# Altium footprint library FootprintsOld.PcbLib: 93 footprints (part 1 of 6)
Each footprint in its own frame and in the unit in brackets; x right, y up, seen from the top. Pads: shape width x height; smd on the part's side, far side on the other; paste and mask are expansions set on the pad; w line width, h text height; cw(c..) or ccw(c..) is an arc to the next point about the centre after c.
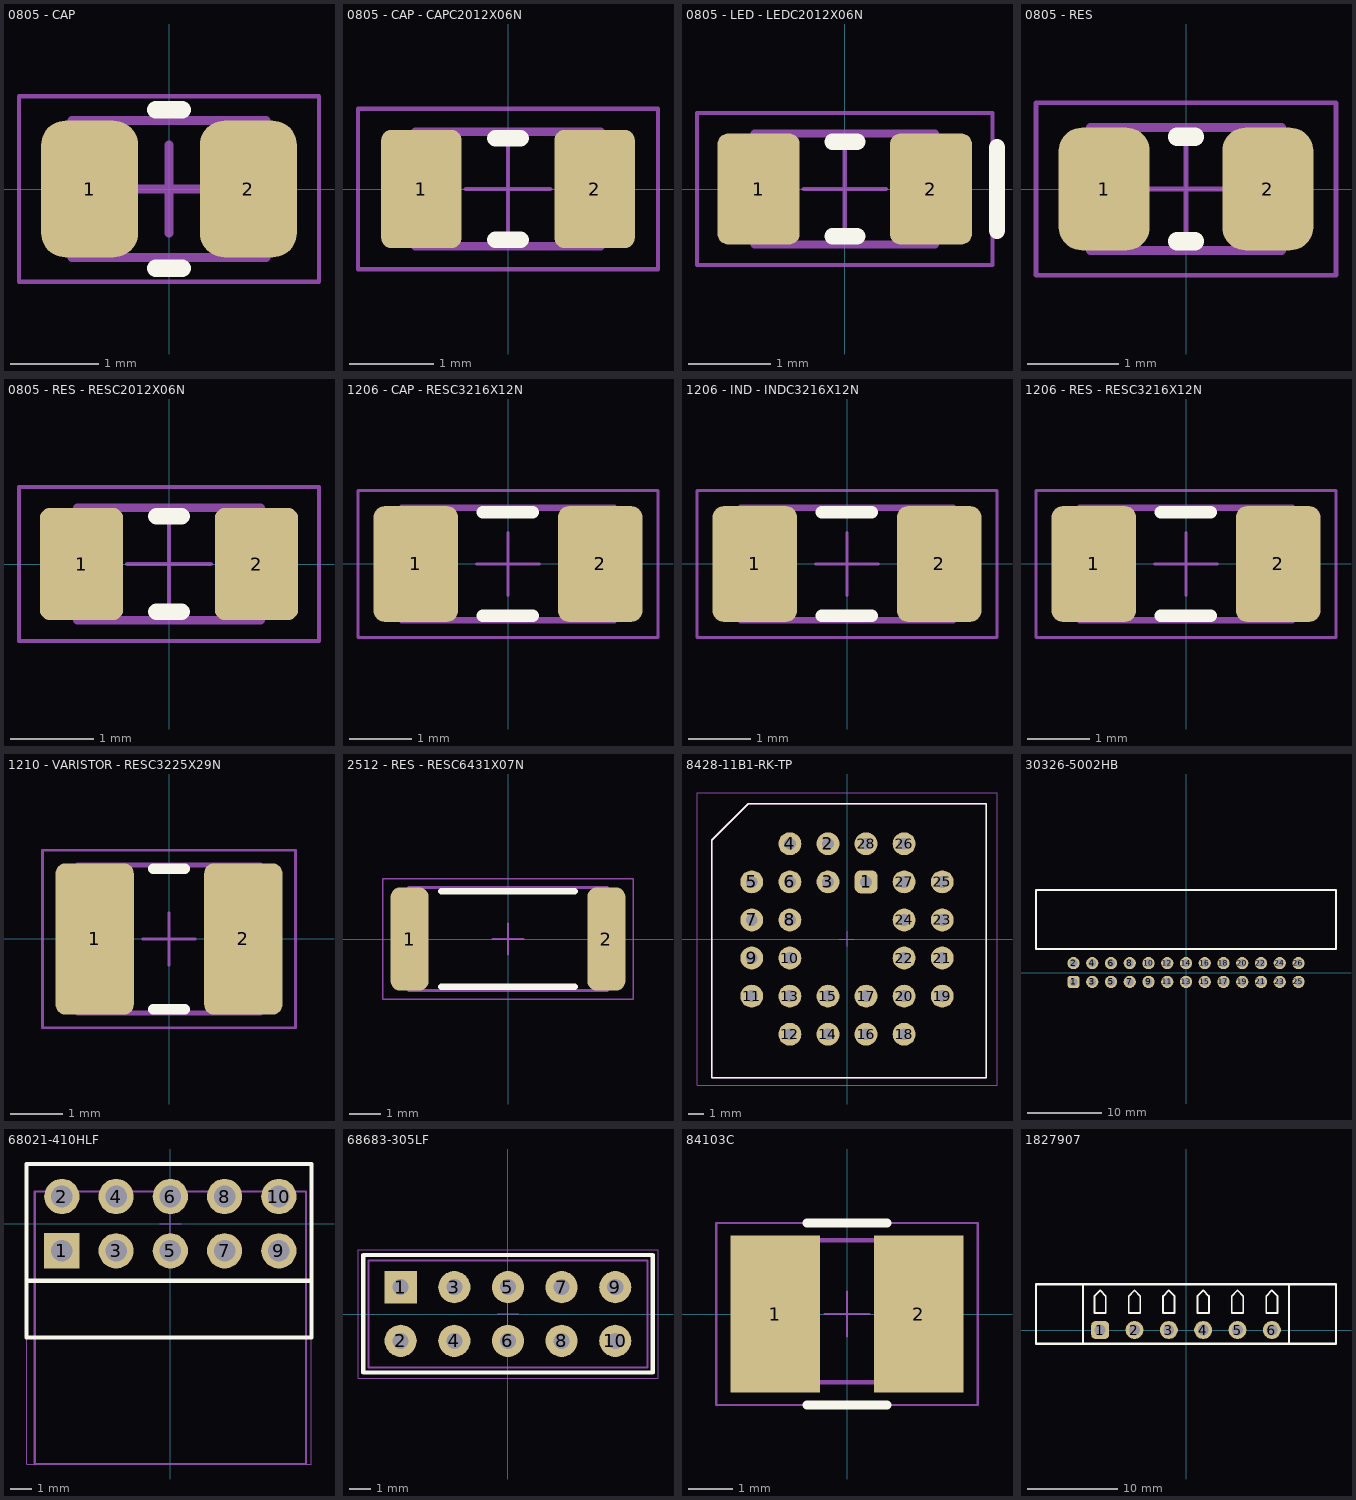
[diagram p0: the footprints below, top view; thin cyan lines are the x and y axes]

## 0805 - CAP [mm] "Chip Capacitor, 2-Leads, Body 2.00x1.30mm, IPC Medium Density"
height 1
pads (2):
  rrect50% 1.1x1.55 smd: 1(-0.9,0) 2(0.9,0)
Top Overlay:
  lines w0.2: -0.15,-0.9 0.15,-0.9 ; -0.15,0.9 0.15,0.9
Top Assembly:
  lines w0.1: -1.1,-0.775 1.1,-0.775 1.1,0.775 -1.1,0.775 -1.1,-0.775
Courtyard Top (Mech10):
  lines w0.05: -1.7,-1.05 1.7,-1.05 1.7,1.05 -1.7,1.05 -1.7,-1.05
  lines w0.1: -0.5,0 0.5,0 ; 0,-0.5 0,0.5
3D body: height 1, standoff 0, extent -0.6,-0.775 0.6,0.775
3D body: height 1, standoff 0, extent 0.6,-0.775 1.1,0.775
3D body: height 1, standoff 0, extent -1.1,-0.775 -0.6,0.775

## 0805 - CAP - CAPC2012X06N [mm] "Chip Capacitor, 2-Leads, Body 2.0x1.3mm, IPC Medium Density"
height 0.6
pads (2):
  rrect25% 0.95x1.4 smd: 1(-1.025,0) 2(1.025,0)
Top Overlay:
  lines w0.2: -0.15,-0.6 0.15,-0.6 ; -0.15,0.6 0.15,0.6
Top Assembly:
  lines w0.05: -0.5,0 0.5,0 ; 0,-0.5 0,0.5
  lines w0.1: -1.1,-0.675 -1.1,0.675 1.1,0.675 1.1,-0.675 -1.1,-0.675
Courtyard Top (Mech10):
  lines w0.05: -1.775,-0.95 -1.775,0.95 1.775,0.95 1.775,-0.95 -1.775,-0.95
3D body "0805 - CAP - CAPC2012X06N.STEP": height 0.61, standoff -0.01, extent -1,-0.61 1.02,0.61

## 0805 - LED - LEDC2012X06N [mm] "Chip Led 2-Leads, Body 2.0x1.3mm, IPC Medium Density"
height 0.6
pads (2):
  rrect25% 1x1.35 smd: 1(-1.05,0) 2(1.05,0)
Top Overlay:
  lines w0.2: -0.15,-0.575 0.15,-0.575 ; -0.15,0.575 0.15,0.575 ; 1.854,-0.508 1.854,0.508
Top Assembly:
  lines w0.1: -1.1,-0.675 -1.1,0.675 1.1,0.675 1.1,-0.675 -1.1,-0.675
Courtyard Top (Mech10):
  lines w0.05: -0.5,0 0.5,0 ; 0,-0.5 0,0.5 ; -1.8,-0.925 1.8,-0.925 1.8,0.925 -1.8,0.925 -1.8,-0.925
3D body "Led0805.STEP": height 1.1, standoff 0, extent -1.01,-0.625 1.01,0.625

## 0805 - RES [mm] "Chip Resistor, 2-Leads, Body 2.00x1.25mm, IPC Medium Density"
height 0.6
pads (2):
  rrect50% 1x1.35 smd: 1(-0.9,0) 2(0.9,0)
Top Overlay:
  lines w0.2: -0.1,-0.575 0.1,-0.575 ; -0.1,0.575 0.1,0.575
Top Assembly:
  lines w0.1: -1.05,-0.675 1.05,-0.675 1.05,0.675 -1.05,0.675 -1.05,-0.675
Courtyard Top (Mech10):
  lines w0.05: -0.5,0 0.5,0 ; 0,-0.5 0,0.5 ; -1.65,-0.95 1.65,-0.95 1.65,0.95 -1.65,0.95 -1.65,-0.95
3D body "0805 - RRS.step": height 0.6, standoff 0, extent -1.05,-0.675 1.05,0.675

## 0805 - RES - RESC2012X06N [mm] "Chip Resistor, 2-Leads, Body 2.0x1.3mm, IPC Medium Density"
height 0.6
pads (2):
  rrect25% 1x1.35 smd: 1(-1.05,0) 2(1.05,0)
Top Overlay:
  lines w0.2: -0.15,-0.575 0.15,-0.575 ; -0.15,0.575 0.15,0.575
Top Assembly:
  lines w0.1: -1.1,-0.675 -1.1,0.675 1.1,0.675 1.1,-0.675 -1.1,-0.675
Courtyard Top (Mech10):
  lines w0.05: -0.5,0 0.5,0 ; 0,-0.5 0,0.5 ; -1.8,-0.925 -1.8,0.925 1.8,0.925 1.8,-0.925 -1.8,-0.925
3D body "0805 - RES - RESC2012X06N.STEP": height 0.61, standoff -0.01, extent -1.01,-0.62 1.01,0.6

## 1206 - CAP - RESC3216X12N [mm] "Chip, 2-Leads, Body 3.2x1.6mm, IPC Medium Density"
height 1.25
pads (2):
  rrect25% 1.35x1.85 smd: 1(-1.475,0) 2(1.475,0)
Top Overlay:
  lines w0.2: -0.4,-0.825 0.4,-0.825 ; -0.4,0.825 0.4,0.825
Top Assembly (Mech13):
  lines w0.1: -1.7,-0.9 1.7,-0.9 1.7,0.9 -1.7,0.9 -1.7,-0.9
Top Courtyard:
  lines w0.05: -0.5,0 0.5,0 ; 0,-0.5 0,0.5 ; -2.4,-1.175 2.4,-1.175 2.4,1.175 -2.4,1.175 -2.4,-1.175
3D body "1206 - RES CAP - RESC3216X12N.STEP": height 1.01, standoff -0.01, extent -1.62,-0.81 1.6,0.81

## 1206 - IND - INDC3216X12N [mm] "Chip, 2-Leads, Body 3.2x1.6mm, IPC Medium Density"
height 1.25
pads (2):
  rrect25% 1.35x1.85 smd: 1(-1.475,0) 2(1.475,0)
Top Overlay:
  lines w0.2: -0.4,-0.825 0.4,-0.825 ; -0.4,0.825 0.4,0.825
Top Assembly (Mech13):
  lines w0.1: -1.7,-0.9 1.7,-0.9 1.7,0.9 -1.7,0.9 -1.7,-0.9
Top Courtyard:
  lines w0.05: -0.5,0 0.5,0 ; 0,-0.5 0,0.5 ; -2.4,-1.175 2.4,-1.175 2.4,1.175 -2.4,1.175 -2.4,-1.175
3D body "1206 - IND - INDC3216X12N.STEP": height 1.01, standoff -0.01, extent -1.6,-0.81 1.62,0.81

## 1206 - RES - RESC3216X12N [mm] "Chip, 2-Leads, Body 3.2x1.6mm, IPC Medium Density"
height 1.25
pads (2):
  rrect25% 1.35x1.85 smd: 1(-1.475,0) 2(1.475,0)
Top Overlay:
  lines w0.2: -0.4,-0.825 0.4,-0.825 ; -0.4,0.825 0.4,0.825
Top Assembly (Mech13):
  lines w0.1: -1.7,-0.9 1.7,-0.9 1.7,0.9 -1.7,0.9 -1.7,-0.9
Top Courtyard:
  lines w0.05: -0.5,0 0.5,0 ; 0,-0.5 0,0.5 ; -2.4,-1.175 2.4,-1.175 2.4,1.175 -2.4,1.175 -2.4,-1.175
3D body "1206 - RES - RESC3216X12N.STEP": height 1.01, standoff -0.01, extent -1.6,-0.81 1.62,0.81

## 1210 - VARISTOR - RESC3225X29N [mm] "Chip, 2-Leads, Body 3.2x2.5mm, IPC Medium Density"
height 2.87
pads (2):
  rrect25% 1.5x2.9 smd: 1(-1.425,0) 2(1.425,0)
Top Overlay:
  lines w0.2: -0.3,-1.35 0.3,-1.35 ; -0.3,1.35 0.3,1.35
Top Assembly (Mech13):
  lines w0.1: -1.75,-1.42 1.75,-1.42 1.75,1.42 -1.75,1.42 -1.75,-1.42
Top Courtyard:
  lines w0.05: -0.5,0 0.5,0 ; 0,-0.5 0,0.5 ; -2.425,-1.7 2.425,-1.7 2.425,1.7 -2.425,1.7 -2.425,-1.7
3D body "1210 - VARISTOR - RESC3225X29N.STEP": height 2.55, standoff -0.01, extent -1.6,-1.445 1.62,1.445

## 2512 - RES - RESC6431X07N [mm] "Chip Resistor, 2-Leads, Body 6.35x3.10mm, IPC Medium Density"
height 0.65
pads (2):
  rrect50% 1.2x3.25 smd: 1(-3.1,0) 2(3.1,0)
Top Overlay:
  lines w0.2: -2.1,-1.5 2.1,-1.5 ; -2.1,1.5 2.1,1.5
Top Assembly (Mech13):
  lines w0.1: -3.125,-1.625 3.125,-1.625 3.125,1.625 -3.125,1.625 -3.125,-1.625
Top Courtyard:
  lines w0.05: -0.5,0 0.5,0 ; 0,-0.5 0,0.5 ; -3.95,-1.9 3.95,-1.9 3.95,1.9 -3.95,1.9 -3.95,-1.9
3D body: height 0.65, standoff 0, extent 2.725,-1.625 3.125,1.625
3D body: height 0.65, standoff 0, extent -3.125,-1.625 -2.725,1.625
3D body "2512 - RES - RESC6331X07N.STEP": height 1.01, standoff -0.01, extent -3.16,-1.61 3.16,1.61

## 8428-11B1-RK-TP [mil] "PLCC 28 SOCKET"
pads (28):
  rrect50% 60x60 hole 31: 1(50,150)
  round 60 hole 31: 2(-50,250) 3(-50,150) 4(-150,250) 5(-250,150) 6(-150,150) 7(-250,50) 8(-150,50) 9(-250,-50) 10(-150,-50) 11(-250,-150) 12(-150,-250) 13(-150,-150) 14(-50,-250) 15(-50,-150) 16(50,-250) 17(50,-150) 18(150,-250) 19(250,-150) 20(150,-150) 21(250,-50) 22(150,-50) 23(250,50) 24(150,50) 25(250,150) 26(150,250) 27(150,150) 28(50,250)
Top Overlay:
  lines w3.94: -355.5,-364.49 -355.5,0 -355.5,259.5 -259.5,355.5 0,355.5 365.23,355.5 365.23,-9.73 365.23,-364.49 -8.99,-364.49 -355.5,-364.49
Top Assembly (Mech13):
  lines w3.94: -354.77,-364.49 -354.77,260.23 -259.43,355.57 365.23,355.57 365.23,-364.49 -354.77,-364.49
Top Courtyard:
  lines w1.97: -19.69,0 19.68,0 ; 0,-19.68 0,19.69 ; -393.7,-383.86 -393.7,383.86 393.7,383.86 393.7,355.5 393.7,-383.86 -393.7,-383.86
3D body "PLCC Socket.STEP": height 328.83, standoff -121.17, extent -354.77,-364.49 365.23,355.57

## 30326-5002HB [mil]
pads (26):
  rrect50% 65x65 hole 42: 1(-600,-50)
  round 65 hole 42: 2(-600,50) 3(-500,-50) 4(-500,50) 5(-400,-50) 6(-400,50) 7(-300,-50) 8(-300,50) 9(-200,-50) 10(-200,50) 11(-100,-50) 12(-100,50) 13(0,-50) 14(0,50) 15(100,-50) 16(100,50) 17(200,-50) 18(200,50) 19(300,-50) 20(300,50) 21(400,-50) 22(400,50) 23(500,-50) 24(500,50) 25(600,-50) 26(600,50)
Top Overlay:
  lines w10: -800,125 -800,440 800,440 800,125 -800,125
3D body: height 10, standoff 0, extent -799.5,-63 799.5,470.5

## 68021-410HLF [mil]
pads (10):
  rect 65x65 hole 40: 1(-200,-50)
  round 65 hole 40: 2(-200,50) 3(-100,-50) 4(-100,50) 5(0,-50) 6(0,50) 7(100,-50) 8(100,50) 9(200,-50) 10(200,50)
Top Overlay:
  lines w7.87: -265,-105 260,-105 ; -265,-210 260,-210 260,110 -265,110 -265,-210
Top Assembly (Mech13):
  lines w3.94: -250,-443 250,-443 250,59.06 -250,59.06 -250,-443
Top Courtyard:
  lines w1.97: -19.69,0 19.68,0 ; 0,-19.68 0,19.68 ; -265,-443 -265,110 260,110 260,-442.91 260,-443 -265,-443
  lines w3.94: -265,-210 260,-210 260,110 -265,110 -265,-210
3D body: height 10, standoff 0, extent -250,-443 250,59.5

## 68683-305LF [mil]
pads (10):
  rect 60x60 hole 30: 1(-200,50)
  round 60 hole 30: 2(-200,-50) 3(-100,50) 4(-100,-50) 5(0,50) 6(0,-50) 7(100,50) 8(100,-50) 9(200,50) 10(200,-50)
Top Overlay:
  lines w7.87: -269.79,-109.28 -269.79,109.72 269.84,109.72 269.84,-109.28 -269.79,-109.28
Top Assembly (Mech13):
  lines w3.94: 260,-99.84 260,100 ; -259.84,-100 259.84,-100 259.84,100 -259.84,100 -259.84,-100
Top Courtyard:
  lines w1.97: -19.69,0 19.68,0 ; 0,-19.68 0,19.69 ; -279.53,-119.68 279.69,-119.68 279.69,119.69 -279.53,119.69 -279.53,-119.68
3D body "User Library-Header 5X2.STEP": height 335.15, standoff -125.48, extent -259.84,-100 259.84,100

## 84103C [mm] "Murata Inductor"
height 1.25
pads (2):
  rect 2x3.5 smd: 1(-1.6,0) 2(1.6,0)
Top Overlay:
  lines w0.2: -0.889,-2.032 0.889,-2.032 ; -0.889,2.032 0.889,2.032
Top Assembly (Mech13):
  lines w0.1: -2.413,-1.524 -2.413,1.651 2.159,1.651 2.159,-1.524 -2.413,-1.524
Top Courtyard:
  lines w0.05: -0.5,0 0.5,0 ; 0,-0.5 0,0.5 ; -2.921,-2.032 -2.921,2.032 2.921,2.032 2.921,-2.032 -2.921,-2.032
3D body "mps_mag_8400_smt_a.step": height 2.62, standoff -0.01, extent -2.25,-1.524 2.25,1.676

## 1827907 [mm] "TERM BLOCK HDR 6POS R/A 3.81M"
pads (6):
  rrect50% 2x2 hole 1.2: 1(-9.525,0)
  round 2 hole 1.2: 2(-5.715,0) 3(-1.905,0) 4(1.905,0) 5(5.715,0) 6(9.525,0)
Top Overlay:
  lines w0.2: -10.16,1.905 -10.16,3.759 -9.525,4.394 -8.89,3.759 -8.89,1.905 -10.16,1.905 ; -6.35,1.905 -5.08,1.905 -5.08,3.759 -5.715,4.394 -6.35,3.759 -6.35,1.905 ; -2.54,1.905 -1.27,1.905 -1.27,3.759 -1.905,4.394 -2.54,3.759 -2.54,1.905 ; 1.27,1.905 2.54,1.905 2.54,3.759 1.905,4.394 1.27,3.759 1.27,1.905 ; 5.08,1.905 6.35,1.905 6.35,3.759 5.715,4.394 5.08,3.759 5.08,1.905 ; 8.89,1.905 10.16,1.905 10.16,3.759 9.525,4.394 8.89,3.759 8.89,1.905
  lines w0.254: -11.43,-1.524 -11.43,5.08 ; 11.43,-1.524 11.43,5.08 ; -16.637,-1.524 -16.637,5.08 16.637,5.08 16.637,-1.524 -16.637,-1.524
3D body "Phoenix1827907.STEP": height 7.3, standoff -3.35, extent -16.625,-1.295 16.625,8.005